# Altium footprint library ACR Components.PcbLib: 45 footprints (part 3 of 3)
Each footprint in its own frame and in the unit in brackets; x right, y up, seen from the top. Pads: shape width x height; smd on the part's side, far side on the other; paste and mask are expansions set on the pad; w line width, h text height; cw(c..) or ccw(c..) is an arc to the next point about the centre after c.
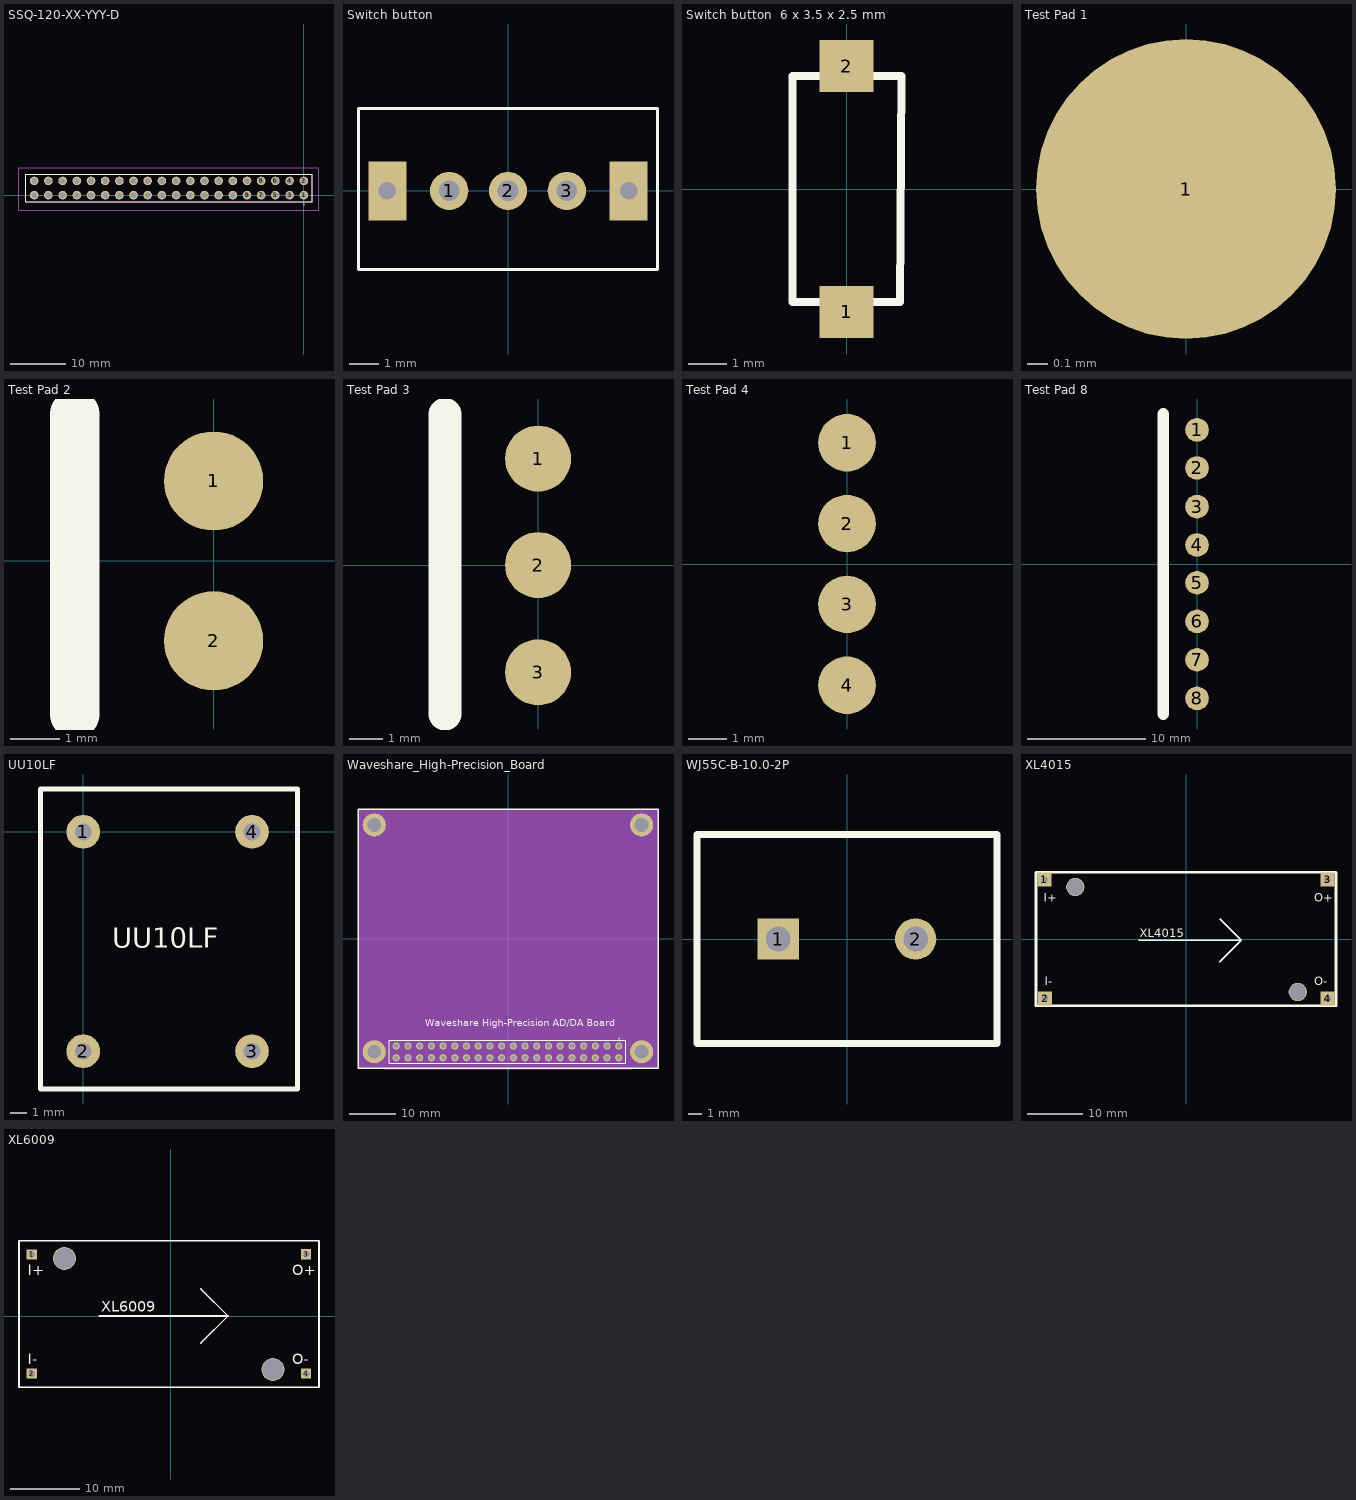
[diagram p2: the footprints below, top view; thin cyan lines are the x and y axes]

## SSQ-120-XX-YYY-D [mm]
pads (40):
  round 1.55 hole 1.02: 1(0,0) 2(0,2.54) 3(-2.54,0) 4(-2.54,2.54) 5(-5.08,0) 6(-5.08,2.54) 7(-7.62,0) 8(-7.62,2.54) 9(-10.16,0) 10(-10.16,2.54) 11(-12.7,0) 12(-12.7,2.54) 13(-15.24,0) 14(-15.24,2.54) 15(-17.78,0) 16(-17.78,2.54) 17(-20.32,0) 18(-20.32,2.54) 19(-22.86,0) 20(-22.86,2.54) 21(-25.4,0) 22(-25.4,2.54) 23(-27.94,0) 24(-27.94,2.54) 25(-30.48,0) 26(-30.48,2.54) 27(-33.02,0) 28(-33.02,2.54) 29(-35.56,0) 30(-35.56,2.54) 31(-38.1,0) 32(-38.1,2.54) 33(-40.64,0) 34(-40.64,2.54) 35(-43.18,0) 36(-43.18,2.54) 37(-45.72,0) 38(-45.72,2.54) 39(-48.26,0) 40(-48.26,2.54)
Top Overlay:
  circle w0.2: c0.05,-1.65 r0.05
  lines w0.1: -49.785,-1.205 -49.785,3.745 1.525,3.745 1.525,-1.205 -49.785,-1.205
Mechanical 13:
  lines w0.2: -49.785,-1.205 -49.785,3.745 1.525,3.745 1.525,-1.205 -49.785,-1.205
Mechanical 15:
  lines w0.05: -50.985,-2.75 -50.985,4.945 2.725,4.945 2.725,-2.75 -50.985,-2.75
3D body "SSQ-120-01-F-D.stp": height 8.51, standoff -2.64, extent -49.774,-1.067 1.534,3.886

## Switch button [mm] "SS12D02-VG4"
pads (5):
  round 1.3 hole 0.7: 1(-2,0) 2(0,0) 3(2,0)
  rect 1.3x2 hole 0.6 square: ""(-4.1,0) ""(4.1,0)
Top Overlay:
  lines w0.1: -5.08,-2.667 -5.08,2.794 5.08,2.794 5.08,-2.667 -5.08,-2.667
3D body "Switch ss-12d02-vg4.STEP": height 8.8, standoff -2.6, extent -4.3,-2.214 4.3,2.286

## Switch button  6 x 3.5 x 2.5 mm [mm] "Interrupteur tactile Wurth Elektronik CMS, SPST, 6 x 3.5 x 2.5mm"
pads (2):
  rect 1.4x1.35 smd: 1(0,-3.175) 2(0,3.175)
Top Overlay:
  lines w0.2: -1.397,-2.921 -1.397,2.921 1.419,2.921 1.38,-2.921 -1.397,-2.921
3D body "SMD 3.5x6.0x2.5.STEP": height 2.6, standoff 0.1, extent -1.5,-3.5 1.5,3.5

## Test Pad 1 [mm]
pads (1):
  round 1.5 smd: 1(0,0)

## Test Pad 2 [mm]
pads (2):
  round 2 smd: 1(0,1.613) 2(0,-1.612)
Top Overlay:
  lines w1: -2.8,-3.088 -2.8,2.962

## Test Pad 3 [mm]
pads (3):
  round 2 smd: 1(0,3.238) 2(0,0.013) 3(0,-3.237)
Top Overlay:
  lines w1: -2.825,-4.5 -2.825,4.587

## Test Pad 4 [mm]
pads (4):
  round 1.5 smd: 1(0,3.162) 2(0,1.054) 3(0,-1.054) 4(0,-3.162)

## Test Pad 8 [mm]
pads (8):
  round 2 smd: 1(0,11.377) 2(0,8.152) 3(0,4.877) 4(0,1.627) 5(0,-1.577) 6(0,-4.852) 7(0,-8.102) 8(0,-11.377)
Top Overlay:
  lines w1: -2.866,-12.698 -2.866,6.64 -2.866,12.727

## UU10LF [mm] "Filtre mode commun Lineaire"
pads (4):
  round 2 hole 1: 1(0,0) 2(0,-13) 3(10,-13) 4(10,0)
Top Overlay:
  lines w0.3: -2.54,-15.24 -2.54,2.54 12.7,2.54 12.7,-15.24 -2.54,-15.24
  text "UU10LF" at 1.714,-6.858 h1.2
3D body "UU10LF.STEP": height 25.3, standoff -3.7, extent -3.42,-15.706 13.58,2.794

## Waveshare_High-Precision_Board [mm]
pads (44):
  round 1.55 hole 1.02: 1(24.022,-23.26) 2(24.022,-25.8) 3(21.482,-23.26) 4(21.482,-25.8) 5(18.942,-23.26) 6(18.942,-25.8) 7(16.402,-23.26) 8(16.402,-25.8) 9(13.862,-23.26) 10(13.862,-25.8) 11(11.322,-23.26) 12(11.322,-25.8) 13(8.782,-23.26) 14(8.782,-25.8) 15(6.242,-23.26) 16(6.242,-25.8) 17(3.702,-23.26) 18(3.702,-25.8) 19(1.162,-23.26) 20(1.162,-25.8) 21(-1.378,-23.26) 22(-1.378,-25.8) 23(-3.918,-23.26) 24(-3.918,-25.8) 25(-6.458,-23.26) 26(-6.458,-25.8) 27(-8.998,-23.26) 28(-8.998,-25.8) 29(-11.538,-23.26) 30(-11.538,-25.8) 31(-14.078,-23.26) 32(-14.078,-25.8) 33(-16.618,-23.26) 34(-16.618,-25.8) 35(-19.158,-23.26) 36(-19.158,-25.8) 37(-21.698,-23.26) 38(-21.698,-25.8) 39(-24.238,-23.26) 40(-24.238,-25.8)
  round 5 hole 3: ""(-29.012,-24.5) ""(-29.012,24.7) ""(28.988,-24.5) ""(28.988,24.7)
Top Overlay:
  circle w0.2: c24.072,-21.61 r0.05
  lines w0.1: -25.763,-27.005 25.547,-27.005 25.547,-22.055 -25.763,-22.055 -25.763,-27.005
  lines w0.3: -32.537,-28.1 32.537,-28.1 32.537,28.1 -32.537,28.1 -32.537,-28.1
  lines w1: 28.987,24.7 28.988,24.7 ; 28.987,24.7 28.987,24.7
  text "Waveshare High-Precision AD/DA Board" at -18,-19 h1.52
Mechanical 1:
  rectangle: -32.533,-28.1 32.537,28.11
Mechanical 13:
  lines w0.2: -25.763,-27.005 25.547,-27.005 25.547,-22.055 -25.763,-22.055 -25.763,-27.005
Mechanical 15:
  lines w0.05: -26.963,-28.205 26.747,-28.205 26.747,-20.51 -26.963,-20.51 -26.963,-28.205
3D body "SSQ-120-01-F-D.stp": height 8.51, standoff -2.64, extent -25.763,-26.977 25.545,-22.023

## WJ55C-B-10.0-2P [mm] "Bornier"
pads (2):
  rect 3x3 hole 1.8 square: 1(-5,0)
  round 3 hole 1.8: 2(5,0)
Top Overlay:
  lines w0.5: -10.922,-7.62 10.922,-7.62 10.922,7.62 -10.922,7.62 -10.922,-7.62
3D body "WJ55C-B-10.0-2P.STEP": height 18.3, standoff -5.3, extent -11,-7.62 11,7.78

## XL4015 [mm] "DC-DC Boost Step Down"
pads (6):
  rect 2.5x2.5 hole 1.2: 1(-25.487,10.7) 2(-25.387,-10.7) 3(25.488,10.7) 4(25.488,-10.7)
  round 3.3 hole 3: ""(-19.937,9.375) ""(20.113,-9.525)
Top Overlay:
  lines w0.254: 6.088,-4.175 6.088,-4.125 9.963,-0.25 ; 6.088,3.675 6.088,3.625 9.963,-0.25 ; 9.963,-0.25 -8.562,-0.25 9.963,-0.25
  lines w0.5: -27.012,11.975 -27.012,-12 26.988,-12 26.988,11.975 ; -26.962,12.025 26.938,12.025
  text "I-" at -25.458,-8.271 h1.52
  text "O-" at 23.092,-8.271 h1.52
  text "O+" at 23.092,6.754 h1.52
  text "I+" at -25.658,6.754 h1.52
  text "XL4015" at -8.309,0.329 h1.52
3D body "XL4015_MODELO_PISTAS.step": height 15.52, standoff 0.77, extent -26.92,-12.024 27.08,11.99

## XL6009 [mm] "DC-DC Boost Step up"
pads (6):
  rect 1.458x1.458 hole 0.95: 1(-19.985,8.872) 2(-19.99,-8.288) 3(19.501,8.883) 4(19.501,-8.288)
  round 3.3 hole 3: ""(-15.291,8.292) ""(14.719,-7.71)
Top Overlay:
  lines w0.254: 4.375,-3.925 4.375,-3.875 8.25,0 ; 4.375,3.925 4.375,3.875 8.25,0 ; 8.25,0 -10.275,0 8.25,0 ; -21.825,-10.25 -21.825,10.832 21.355,10.832 21.355,-10.25 -21.825,-10.25
  text "XL6009" at -10.021,0.579 h1.52
  text "I+" at -20.596,5.879 h1.52
  text "O+" at 17.479,5.879 h1.52
  text "O-" at 17.479,-6.971 h1.52
  text "I-" at -20.596,-6.971 h1.52
3D body "User Library-XL6009-LM2577.STEP": height 15.77, standoff -2.46, extent -21.825,-10.25 21.355,10.832